# Altium footprint library My_lib.PcbLib: 63 footprints (part 2 of 4)
Each footprint in its own frame and in the unit in brackets; x right, y up, seen from the top. Pads: shape width x height; smd on the part's side, far side on the other; paste and mask are expansions set on the pad; w line width, h text height; cw(c..) or ccw(c..) is an arc to the next point about the centre after c.
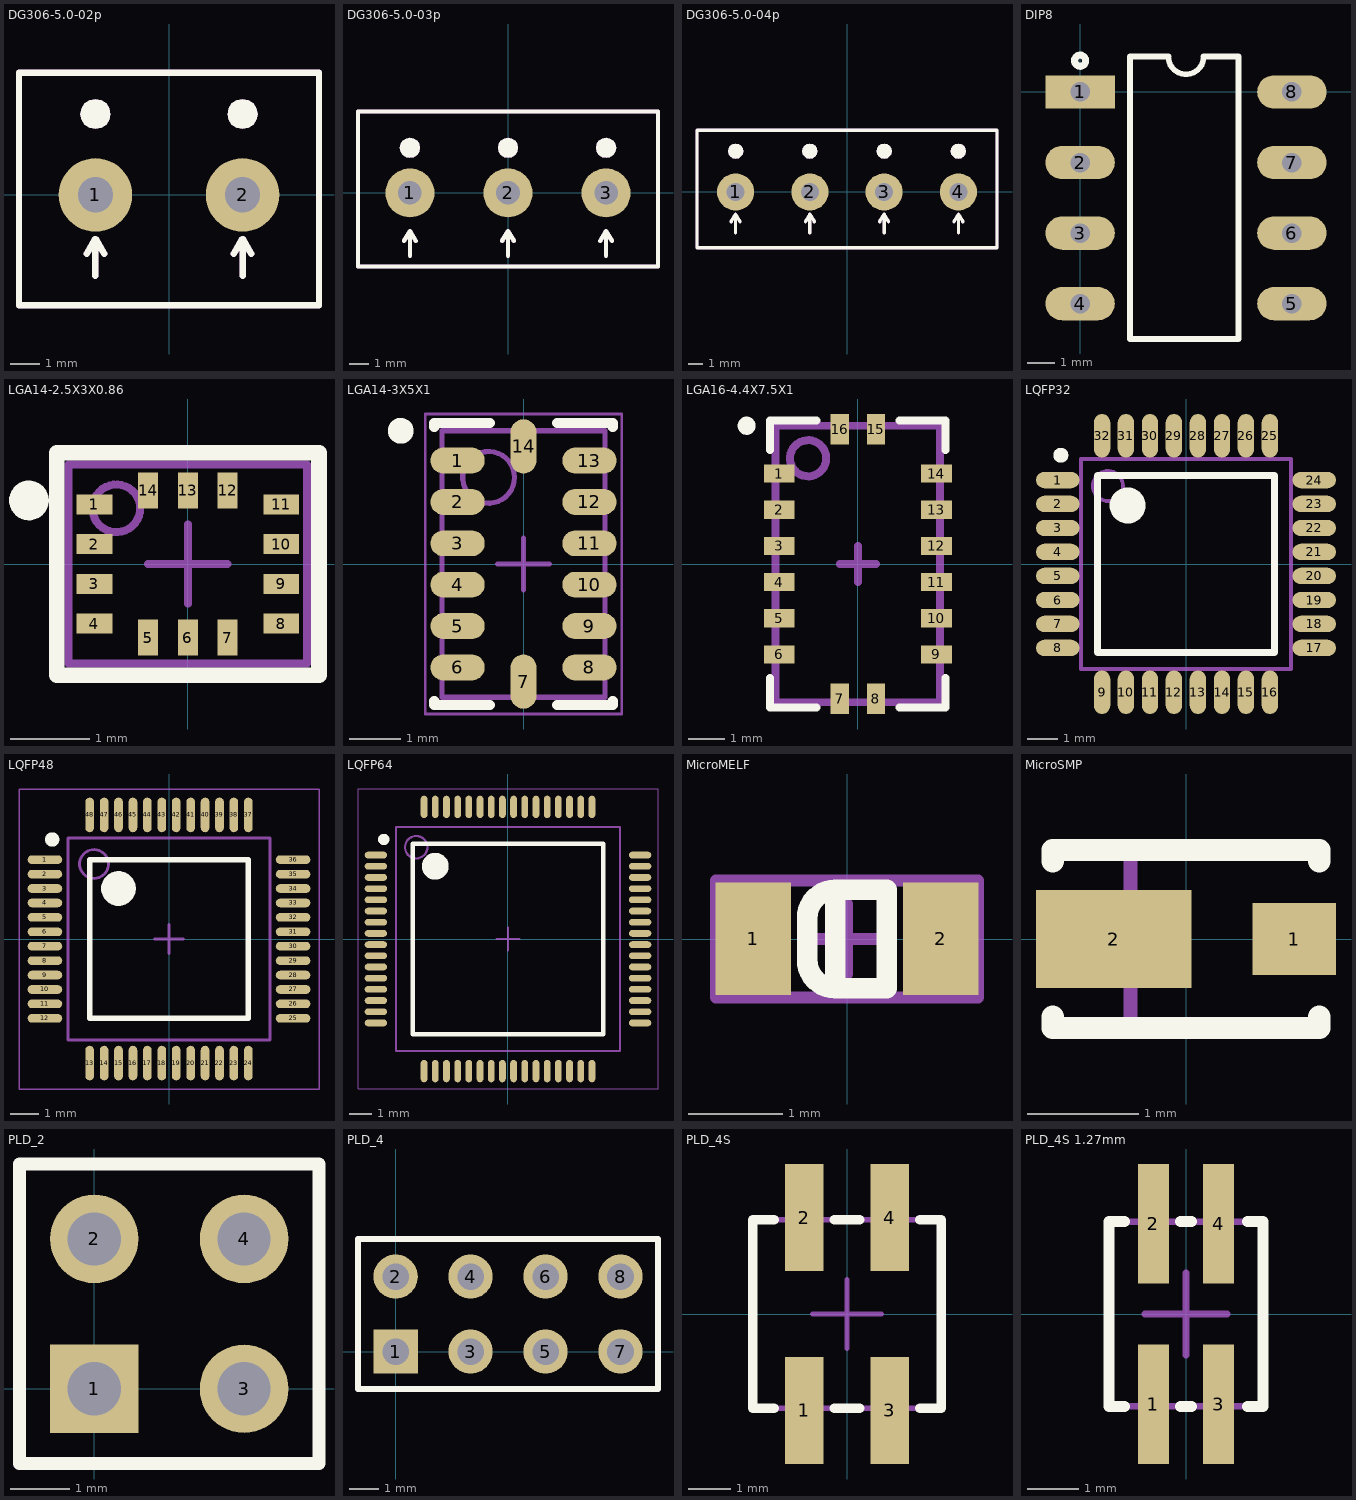
[diagram p1: the footprints below, top view; thin cyan lines are the x and y axes]

## DG306-5.0-02p [mm] "DG306-5.0-2p Connector"
height 10
pads (2):
  round 2.5 hole 1.2: 1(-2.5,0) 2(2.5,0)
Top Overlay:
  region: 2.5,2.24 2.305,2.279 2.14,2.39 2.029,2.555 1.99,2.75 2.029,2.945 2.14,3.11 2.305,3.221 2.5,3.26 2.695,3.221 2.86,3.11 2.971,2.945 3.01,2.75 2.971,2.555 2.86,2.39 2.695,2.279
  region: -2.5,2.24 -2.695,2.279 -2.86,2.39 -2.971,2.555 -3.01,2.75 -2.971,2.945 -2.86,3.11 -2.695,3.221 -2.5,3.26 -2.305,3.221 -2.14,3.11 -2.029,2.945 -1.99,2.75 -2.029,2.555 -2.14,2.39 -2.305,2.279
  lines w0.22: -2.8,-2 -2.5,-1.5 ; -2.5,-2.75 -2.5,-1.5 ; -2.2,-2 -2.5,-1.5 ; 2.2,-2 2.5,-1.5 ; 2.5,-2.75 2.5,-1.5 ; 2.8,-2 2.5,-1.5 ; -5.1,-3.75 5.1,-3.75 5.1,4.15 -5.1,4.15 -5.1,-3.75
Top_Assy:
  region: 2.5,2.24 2.305,2.279 2.14,2.39 2.029,2.555 1.99,2.75 2.029,2.945 2.14,3.11 2.305,3.221 2.5,3.26 2.695,3.221 2.86,3.11 2.971,2.945 3.01,2.75 2.971,2.555 2.86,2.39 2.695,2.279
  region: -2.5,2.24 -2.695,2.279 -2.86,2.39 -2.971,2.555 -3.01,2.75 -2.971,2.945 -2.86,3.11 -2.695,3.221 -2.5,3.26 -2.305,3.221 -2.14,3.11 -2.029,2.945 -1.99,2.75 -2.029,2.555 -2.14,2.39 -2.305,2.279
  lines w0.22: -2.8,-2 -2.5,-1.5 ; -2.5,-2.75 -2.5,-1.5 ; -2.2,-2 -2.5,-1.5 ; 2.2,-2 2.5,-1.5 ; 2.5,-2.75 2.5,-1.5 ; 2.8,-2 2.5,-1.5 ; -5.1,-3.75 5.1,-3.75 5.1,4.15 -5.1,4.15 -5.1,-3.75
3D body: height 10, standoff -4, extent -5,-3.5 5,4

## DG306-5.0-03p [mm] "DG306-5.0-3p Connector"
height 10
pads (3):
  round 2.5 hole 1.2: 1(-5,0) 2(0,0) 3(5,0)
Top Overlay:
  region: 4.49,2.3 4.529,2.105 4.64,1.94 4.805,1.829 5,1.79 5.195,1.829 5.36,1.94 5.471,2.105 5.51,2.3 5.471,2.495 5.36,2.66 5.195,2.771 5,2.81 4.805,2.771 4.64,2.66 4.529,2.495
  region: 0,1.79 -0.195,1.829 -0.36,1.94 -0.471,2.105 -0.51,2.3 -0.471,2.495 -0.36,2.66 -0.195,2.771 0,2.81 0.195,2.771 0.36,2.66 0.471,2.495 0.51,2.3 0.471,2.105 0.36,1.94 0.195,1.829
  region: -5,1.79 -5.195,1.829 -5.36,1.94 -5.471,2.105 -5.51,2.3 -5.471,2.495 -5.36,2.66 -5.195,2.771 -5,2.81 -4.805,2.771 -4.64,2.66 -4.529,2.495 -4.49,2.3 -4.529,2.105 -4.64,1.94 -4.805,1.829
  lines w0.22: -5.3,-2.45 -5,-1.95 ; -5,-3.2 -5,-1.95 ; -4.7,-2.45 -5,-1.95 ; -0.3,-2.45 0,-1.95 ; 0,-3.2 0,-1.95 ; 0.3,-2.45 0,-1.95 ; 4.7,-2.45 5,-1.95 ; 5,-3.2 5,-1.95 ; 5.3,-2.45 5,-1.95 ; -7.65,-3.75 -7.65,4.15 7.65,4.15 7.65,-3.75 -7.65,-3.75
Top_Assy:
  region: 4.49,2.3 4.529,2.105 4.64,1.94 4.805,1.829 5,1.79 5.195,1.829 5.36,1.94 5.471,2.105 5.51,2.3 5.471,2.495 5.36,2.66 5.195,2.771 5,2.81 4.805,2.771 4.64,2.66 4.529,2.495
  region: 0,1.79 -0.195,1.829 -0.36,1.94 -0.471,2.105 -0.51,2.3 -0.471,2.495 -0.36,2.66 -0.195,2.771 0,2.81 0.195,2.771 0.36,2.66 0.471,2.495 0.51,2.3 0.471,2.105 0.36,1.94 0.195,1.829
  region: -5,1.79 -5.195,1.829 -5.36,1.94 -5.471,2.105 -5.51,2.3 -5.471,2.495 -5.36,2.66 -5.195,2.771 -5,2.81 -4.805,2.771 -4.64,2.66 -4.529,2.495 -4.49,2.3 -4.529,2.105 -4.64,1.94 -4.805,1.829
  lines w0.22: -5.3,-2.45 -5,-1.95 ; -5,-3.2 -5,-1.95 ; -4.7,-2.45 -5,-1.95 ; -0.3,-2.45 0,-1.95 ; 0,-3.2 0,-1.95 ; 0.3,-2.45 0,-1.95 ; 4.7,-2.45 5,-1.95 ; 5,-3.2 5,-1.95 ; 5.3,-2.45 5,-1.95 ; -7.65,-3.75 -7.65,4.15 7.65,4.15 7.65,-3.75 -7.65,-3.75
3D body: height 10, standoff -4, extent -7.5,-3.5 7.5,4

## DG306-5.0-04p [mm] "DG306-5.0-4p Connector"
height 10
pads (4):
  round 2.5 hole 1.2: 1(-7.5,0) 2(-2.5,0) 3(2.5,0) 4(7.5,0)
Top Overlay:
  region: 6.99,2.75 7.029,2.555 7.14,2.39 7.305,2.279 7.5,2.24 7.695,2.279 7.86,2.39 7.971,2.555 8.01,2.75 7.971,2.945 7.86,3.11 7.695,3.221 7.5,3.26 7.305,3.221 7.14,3.11 7.029,2.945
  region: -7.5,2.24 -7.695,2.279 -7.86,2.39 -7.971,2.555 -8.01,2.75 -7.971,2.945 -7.86,3.11 -7.695,3.221 -7.5,3.26 -7.305,3.221 -7.14,3.11 -7.029,2.945 -6.99,2.75 -7.029,2.555 -7.14,2.39 -7.305,2.279
  region: 2.5,2.24 2.305,2.279 2.14,2.39 2.029,2.555 1.99,2.75 2.029,2.945 2.14,3.11 2.305,3.221 2.5,3.26 2.695,3.221 2.86,3.11 2.971,2.945 3.01,2.75 2.971,2.555 2.86,2.39 2.695,2.279
  region: -2.5,2.24 -2.695,2.279 -2.86,2.39 -2.971,2.555 -3.01,2.75 -2.971,2.945 -2.86,3.11 -2.695,3.221 -2.5,3.26 -2.305,3.221 -2.14,3.11 -2.029,2.945 -1.99,2.75 -2.029,2.555 -2.14,2.39 -2.305,2.279
  lines w0.22: -7.8,-2 -7.5,-1.5 ; -7.5,-2.75 -7.5,-1.5 ; -7.2,-2 -7.5,-1.5 ; -2.8,-2 -2.5,-1.5 ; -2.5,-2.75 -2.5,-1.5 ; -2.2,-2 -2.5,-1.5 ; 2.2,-2 2.5,-1.5 ; 2.5,-2.75 2.5,-1.5 ; 2.8,-2 2.5,-1.5 ; 7.2,-2 7.5,-1.5 ; 7.5,-2.75 7.5,-1.5 ; 7.8,-2 7.5,-1.5 ; -10.1,-3.75 10.1,-3.75 10.1,4.15 -10.1,4.15 -10.1,-3.75
Top_Assy:
  region: 6.99,2.75 7.029,2.555 7.14,2.39 7.305,2.279 7.5,2.24 7.695,2.279 7.86,2.39 7.971,2.555 8.01,2.75 7.971,2.945 7.86,3.11 7.695,3.221 7.5,3.26 7.305,3.221 7.14,3.11 7.029,2.945
  region: -7.5,2.24 -7.695,2.279 -7.86,2.39 -7.971,2.555 -8.01,2.75 -7.971,2.945 -7.86,3.11 -7.695,3.221 -7.5,3.26 -7.305,3.221 -7.14,3.11 -7.029,2.945 -6.99,2.75 -7.029,2.555 -7.14,2.39 -7.305,2.279
  region: 2.5,2.24 2.305,2.279 2.14,2.39 2.029,2.555 1.99,2.75 2.029,2.945 2.14,3.11 2.305,3.221 2.5,3.26 2.695,3.221 2.86,3.11 2.971,2.945 3.01,2.75 2.971,2.555 2.86,2.39 2.695,2.279
  region: -2.5,2.24 -2.695,2.279 -2.86,2.39 -2.971,2.555 -3.01,2.75 -2.971,2.945 -2.86,3.11 -2.695,3.221 -2.5,3.26 -2.305,3.221 -2.14,3.11 -2.029,2.945 -1.99,2.75 -2.029,2.555 -2.14,2.39 -2.305,2.279
  lines w0.22: -7.8,-2 -7.5,-1.5 ; -7.5,-2.75 -7.5,-1.5 ; -7.2,-2 -7.5,-1.5 ; -2.8,-2 -2.5,-1.5 ; -2.5,-2.75 -2.5,-1.5 ; -2.2,-2 -2.5,-1.5 ; 2.2,-2 2.5,-1.5 ; 2.5,-2.75 2.5,-1.5 ; 2.8,-2 2.5,-1.5 ; 7.2,-2 7.5,-1.5 ; 7.5,-2.75 7.5,-1.5 ; 7.8,-2 7.5,-1.5 ; -10.1,-3.75 10.1,-3.75 10.1,4.15 -10.1,4.15 -10.1,-3.75
3D body: height 10, standoff -4, extent -10,-3.5 10,4

## DIP8 [mm]
pads (8):
  rect 2.5x1.2 hole 0.7: 1(0,0)
  oval 2.5x1.2 hole 0.7: 2(0,-2.54) 3(0,-5.08) 4(0,-7.62) 5(7.62,-7.62) 6(7.62,-5.08) 7(7.62,-2.54) 8(7.62,0)
Top Overlay:
  circle w0.254: c0,1.125 r0.2
  lines w0.2: 3.175,1.27 ccw(c3.81,1.27) 4.445,1.27
  lines w0.22: 3.175,1.27 1.8,1.27 1.8,-8.89 5.7,-8.89 5.7,1.27 4.445,1.27

## LGA14-2.5X3X0.86 [mm] "PQFN, 14-Leads, Body 2.5x3mm, Pitch 0.5mm, IPC High Density"
height 0.86
pads (14):
  rect 0.45x0.25 smd: 1(-1.175,0.75) 2(-1.175,0.25) 3(-1.175,-0.25) 4(-1.175,-0.75) 8(1.175,-0.75) 9(1.175,-0.25) 10(1.175,0.25) 11(1.175,0.75)
  rect 0.25x0.45 smd: 5(-0.5,-0.925) 6(0,-0.925) 7(0.5,-0.925) 12(0.5,0.925) 13(0,0.925) 14(-0.5,0.925)
Top Overlay:
  circle w0.25: c-2,0.8 r0.125
  lines w0.2: -1.65,-1.4 1.65,-1.4 1.65,1.4 -1.65,1.4 -1.65,-1.4
Top_Assy:
  circle w0.1: c-0.9,0.7 r0.3
  lines w0.1: -1.5,-1.25 -1.5,1.25 1.5,1.25 1.5,-1.25 -1.5,-1.25
Mechanical 15:
  lines w0.1: -0.5,0 0.5,0 ; 0,-0.5 0,0.5
3D body: height 0.86, standoff 0, extent -1.5,-1.25 1.5,1.25

## LGA14-3X5X1 [mm] "PQFN, 14-Leads, Body 3x5mm, Pitch 0.8mm, IPC High Density"
height 1
pads (14):
  oval 1.05x0.5 smd: 1(-1.275,2) 2(-1.275,1.2) 3(-1.275,0.4) 4(-1.275,-0.4) 5(-1.275,-1.2) 6(-1.275,-2) 8(1.275,-2) 9(1.275,-1.2) 10(1.275,-0.4) 11(1.275,0.4) 12(1.275,1.2) 13(1.275,2)
  oval 0.5x1.05 smd: 7(0,-2.275) 14(0,2.275)
Top Overlay:
  circle w0.25: c-2.375,2.575 r0.125
  lines w0.2: -1.725,-2.65 -1.725,-2.725 -0.65,-2.725 ; -1.725,2.65 -1.725,2.725 -0.65,2.725 ; 0.65,-2.725 1.725,-2.725 1.725,-2.65 ; 0.65,2.725 1.725,2.725 1.725,2.65
Top_Assy:
  circle w0.1: c-0.675,1.675 r0.5
  lines w0.1: -1.575,-2.575 -1.575,2.575 1.575,2.575 1.575,-2.575 -1.575,-2.575
Mechanical 15:
  lines w0.05: -1.9,-2.9 -1.9,2.9 1.9,2.9 1.9,-2.9 -1.9,-2.9
  lines w0.1: -0.5,0 0.5,0 ; 0,-0.5 0,0.5
3D body: height 1.03, standoff -0.4, extent -1.49,-2.5 1.51,2.5

## LGA16-4.4X7.5X1 [mm] "PQFN, 16-Leads, Body 4.4x7.5mm, Pitch 1mm, IPC Medium Density"
height 1
pads (16):
  rect 0.85x0.5 smd: 1(-2.175,2.5) 2(-2.175,1.5) 3(-2.175,0.5) 4(-2.175,-0.5) 5(-2.175,-1.5) 6(-2.175,-2.5) 9(2.175,-2.5) 10(2.175,-1.5) 11(2.175,-0.5) 12(2.175,0.5) 13(2.175,1.5) 14(2.175,2.5)
  rect 0.5x0.85 smd: 7(-0.5,-3.725) 8(0.5,-3.725) 15(0.5,3.725) 16(-0.5,3.725)
Top Overlay:
  circle w0.25: c-3.075,3.825 r0.125
  lines w0.22: -2.425,-3.15 -2.425,-3.975 -1.15,-3.975 ; -2.425,3.15 -2.425,3.975 -1.15,3.975 ; 1.15,-3.975 2.425,-3.975 2.425,-3.15 ; 1.15,3.975 2.425,3.975 2.425,3.15
Top_Assy:
  circle w0.22: c-1.375,2.925 r0.5
  lines w0.22: -0.5,0 0.5,0 ; 0,-0.5 0,0.5 ; -2.275,-3.825 2.275,-3.825 2.275,3.825 -2.275,3.825 -2.275,-3.825
3D body: height 1, standoff 0, extent -2.275,-3.825 2.275,3.825

## LQFP32 [mm] "QFP, 32-Leads, Body 7x7mm, Pitch 0.8mm, IPC Medium Density"
height 1.6
pads (32):
  oval 1.45x0.55 smd: 1(-4.275,2.8) 2(-4.275,2) 3(-4.275,1.2) 4(-4.275,0.4) 5(-4.275,-0.4) 6(-4.275,-1.2) 7(-4.275,-2) 8(-4.275,-2.8) 17(4.275,-2.8) 18(4.275,-2) 19(4.275,-1.2) 20(4.275,-0.4) 21(4.275,0.4) 22(4.275,1.2) 23(4.275,2) 24(4.275,2.8)
  oval 0.55x1.45 smd: 9(-2.8,-4.275) 10(-2,-4.275) 11(-1.2,-4.275) 12(-0.4,-4.275) 13(0.4,-4.275) 14(1.2,-4.275) 15(2,-4.275) 16(2.8,-4.275) 25(2.8,4.275) 26(2,4.275) 27(1.2,4.275) 28(0.4,4.275) 29(-0.4,4.275) 30(-1.2,4.275) 31(-2,4.275) 32(-2.8,4.275)
Top Overlay:
  circle w0.25: c-4.175,3.625 r0.125
  circle w0.6: c-1.95,1.95 r0.3
  lines w0.22: -2.95,-2.95 -2.95,2.95 2.95,2.95 2.95,-2.95 -2.95,-2.95
Top_Assy:
  circle w0.127: c-2.6,2.6 r0.5
  lines w0.127: -3.5,-3.5 -3.5,3.5 3.5,3.5 3.5,-3.5 -3.5,-3.5
3D body: height 1.1, standoff 0, extent -4.5,-4.5 4.5,4.5

## LQFP48 [mm] "QFP, 48-Leads, Body 7x7mm, Pitch 0.5mm, IPC Medium Density"
height 1.6
pads (48):
  oval 1.2x0.3 smd: 1(-4.3,2.75) 2(-4.3,2.25) 3(-4.3,1.75) 4(-4.3,1.25) 5(-4.3,0.75) 6(-4.3,0.25) 7(-4.3,-0.25) 8(-4.3,-0.75) 9(-4.3,-1.25) 10(-4.3,-1.75) 11(-4.3,-2.25) 12(-4.3,-2.75) 25(4.3,-2.75) 26(4.3,-2.25) 27(4.3,-1.75) 28(4.3,-1.25) 29(4.3,-0.75) 30(4.3,-0.25) 31(4.3,0.25) 32(4.3,0.75) 33(4.3,1.25) 34(4.3,1.75) 35(4.3,2.25) 36(4.3,2.75)
  oval 0.3x1.2 smd: 13(-2.75,-4.3) 14(-2.25,-4.3) 15(-1.75,-4.3) 16(-1.25,-4.3) 17(-0.75,-4.3) 18(-0.25,-4.3) 19(0.25,-4.3) 20(0.75,-4.3) 21(1.25,-4.3) 22(1.75,-4.3) 23(2.25,-4.3) 24(2.75,-4.3) 37(2.75,4.3) 38(2.25,4.3) 39(1.75,4.3) 40(1.25,4.3) 41(0.75,4.3) 42(0.25,4.3) 43(-0.25,4.3) 44(-0.75,4.3) 45(-1.25,4.3) 46(-1.75,4.3) 47(-2.25,4.3) 48(-2.75,4.3)
Top Overlay:
  circle w0.25: c-4.05,3.45 r0.125
  circle w0.6: c-1.75,1.75 r0.3
  lines w0.2: -2.75,-2.75 -2.75,2.75 2.75,2.75 2.75,-2.75 -2.75,-2.75
Top_Assy:
  circle w0.1: c-2.6,2.6 r0.5
  lines w0.1: -3.5,-3.5 -3.5,3.5 3.5,3.5 3.5,-3.5 -3.5,-3.5
Mechanical 15:
  lines w0.05: -5.2,-5.2 -5.2,5.2 5.2,5.2 5.2,-5.2 -5.2,-5.2
  lines w0.1: -0.5,0 0.5,0 ; 0,-0.5 0,0.5
3D body: height 1.6, standoff 0, extent -4.5,-4.5 4.5,4.5

## LQFP64 [mm] "Thin QFP, 64-Leads, Body 10x10mm, Pitch 0.5mm, IPC Medium Density"
height 1.6
pads (64):
  oval 1x0.3 smd: 1(-5.9,3.75) 2(-5.9,3.25) 3(-5.9,2.75) 4(-5.9,2.25) 5(-5.9,1.75) 6(-5.9,1.25) 7(-5.9,0.75) 8(-5.9,0.25) 9(-5.9,-0.25) 10(-5.9,-0.75) 11(-5.9,-1.25) 12(-5.9,-1.75) 13(-5.9,-2.25) 14(-5.9,-2.75) 15(-5.9,-3.25) 16(-5.9,-3.75) 33(5.9,-3.75) 34(5.9,-3.25) 35(5.9,-2.75) 36(5.9,-2.25) 37(5.9,-1.75) 38(5.9,-1.25) 39(5.9,-0.75) 40(5.9,-0.25) 41(5.9,0.25) 42(5.9,0.75) 43(5.9,1.25) 44(5.9,1.75) 45(5.9,2.25) 46(5.9,2.75) 47(5.9,3.25) 48(5.9,3.75)
  oval 0.3x1 smd: 17(-3.75,-5.9) 18(-3.25,-5.9) 19(-2.75,-5.9) 20(-2.25,-5.9) 21(-1.75,-5.9) 22(-1.25,-5.9) 23(-0.75,-5.9) 24(-0.25,-5.9) 25(0.25,-5.9) 26(0.75,-5.9) 27(1.25,-5.9) 28(1.75,-5.9) 29(2.25,-5.9) 30(2.75,-5.9) 31(3.25,-5.9) 32(3.75,-5.9) 49(3.75,5.9) 50(3.25,5.9) 51(2.75,5.9) 52(2.25,5.9) 53(1.75,5.9) 54(1.25,5.9) 55(0.75,5.9) 56(0.25,5.9) 57(-0.25,5.9) 58(-0.75,5.9) 59(-1.25,5.9) 60(-1.75,5.9) 61(-2.25,5.9) 62(-2.75,5.9) 63(-3.25,5.9) 64(-3.75,5.9)
Top Overlay:
  circle w0.6: c-3.25,3.25 r0.3
  circle w0.25: c-5.55,4.45 r0.125
  lines w0.2: -4.25,-4.25 4.25,-4.25 4.25,4.25 -4.25,4.25 -4.25,-4.25
Top_Assy:
  circle w0.1: c-4.1,4.1 r0.5
  lines w0.1: -5,-5 5,-5 5,5 -5,5 -5,-5
Mechanical 15:
  lines w0.05: -6.7,-6.7 6.7,-6.7 6.7,6.7 -6.7,6.7 -6.7,-6.7
  lines w0.1: -0.5,0 0.5,0 ; 0,-0.5 0,0.5
3D body: height 1.6, standoff 0, extent -6,-6 6,6

## MicroMELF [mm] "Chip, Body 3.7x1.6mm"
height 1.2
pads (2):
  rect 0.8x1.2 smd: 1(-1,0) 2(1,0)
Top Overlay:
  lines w0.22: -0.125,-0.525 cw(c-0.125,-0.225) -0.425,-0.225 -0.425,0.225 cw(c-0.125,0.225) -0.125,0.525 ; -0.125,-0.525 0.425,-0.525 0.425,0.525 -0.125,0.525 ; -0.125,-0.525 -0.125,0.525
Top_Assy:
  lines w0.127: -0.375,0 0.375,0 ; 0,-0.375 0,0.375 ; -1.4,-0.625 -1.4,0.625 1.4,0.625 1.4,-0.625 -1.4,-0.625
3D body: height 1.22, standoff 0.02, extent -0.9,-0.6 0.9,0.6

## MicroSMP [mm] "MicroSMP; 2 Leads"
height 0.68
pads (2):
  rect 0.75x0.65 smd: 1(0.975,0)
  rect 1.4x0.88 smd: 2(-0.65,0)
Top Overlay:
  lines w0.2: -1.2,-0.7 -1.2,-0.8 1.2,-0.8 1.2,-0.7 ; -1.2,0.7 -1.2,0.8 1.2,0.8 1.2,0.7
Top_Assy:
  lines w0.127: -1.2,-0.7 -1.2,-0.8 1.2,-0.8 1.2,-0.7 ; -1.2,0.7 -1.2,0.8 1.2,0.8 1.2,0.7 ; -0.5,-0.8 -0.5,0.8
3D body: height 0.73, standoff 0, extent -1.35,-0.7 1.35,0.7

## PLD_2 [mm] "Connector; Header; 2x2 Position"
pads (4):
  rect 1.5x1.5 hole 0.9: 1(0,0)
  round 1.5 hole 0.9: 2(0,2.54) 3(2.54,0) 4(2.54,2.54)
Top Overlay:
  lines w0.22: -1.27,-1.27 3.81,-1.27 3.81,3.81 -1.27,3.81 -1.27,-1.27
Top_Assy:
  lines w0.2: -1.275,-1.275 3.805,-1.275 3.805,3.805 -1.275,3.805 -1.275,-1.275
3D body: height 9.5, standoff -3.2, extent -1.27,-1.27 3.81,3.81

## PLD_4 [mm] "Connector; Header; 4x2 Position"
pads (8):
  rect 1.5x1.5 hole 0.9: 1(0,0)
  round 1.5 hole 0.9: 2(0,2.54) 3(2.54,0) 4(2.54,2.54) 5(5.08,0) 6(5.08,2.54) 7(7.62,0) 8(7.62,2.54)
Top Overlay:
  lines w0.2: -1.27,-1.27 8.89,-1.27 8.89,3.81 -1.27,3.81 -1.27,-1.27
Top_Assy:
  lines w0.2: -1.275,-1.265 -1.275,3.815 8.885,3.815 8.885,-1.265 -1.275,-1.265
3D body: height 9.5, standoff -3.2, extent -1.27,-1.27 8.89,3.81

## PLD_4S [mm] "PLD_4S"
height 6
pads (4):
  rect 0.9x2.5 smd: 1(-1,-2.25) 2(-1,2.25) 3(1,-2.25) 4(1,2.25)
Top Overlay:
  lines w0.22: -1.7,-2.2 -2.2,-2.2 -2.2,2.2 -1.7,2.2 ; -0.3,-2.2 0.3,-2.2 ; -0.3,2.2 0.3,2.2 ; 1.7,-2.2 2.2,-2.2 2.2,2.2 1.7,2.2
Top_Assy:
  lines w0.127: -0.8,0 0.8,0 ; 0,-0.8 0,0.8 ; -2.2,-2.2 2.2,-2.2 2.2,2.2 -2.2,2.2 -2.2,-2.2

## PLD_4S 1.27mm [mm] "PLD_4S 1.27mm"
height 6
pads (4):
  rect 0.6x2.33 smd: 1(-0.635,-1.755) 2(-0.635,1.755) 3(0.635,-1.755) 4(0.635,1.755)
Top Overlay:
  lines w0.22: -1.2,-1.8 -1.5,-1.8 -1.5,1.8 -1.2,1.8 ; -0.1,-1.8 0.1,-1.8 ; -0.1,1.8 0.1,1.8 ; 1.2,-1.8 1.5,-1.8 1.5,1.8 1.2,1.8
Top_Assy:
  lines w0.127: -0.8,0 0.8,0 ; 0,-0.8 0,0.8 ; -1.5,-1.8 -1.5,1.8 1.5,1.8 1.5,-1.8 -1.5,-1.8
3D body: height 4.5, standoff 0, extent -1.27,-2.75 1.27,2.75